# Altium footprint library Test_Stand_Pergam.PcbLib: 34 footprints (part 3 of 3)
Each footprint in its own frame and in the unit in brackets; x right, y up, seen from the top. Pads: shape width x height; smd on the part's side, far side on the other; paste and mask are expansions set on the pad; w line width, h text height; cw(c..) or ccw(c..) is an arc to the next point about the centre after c.
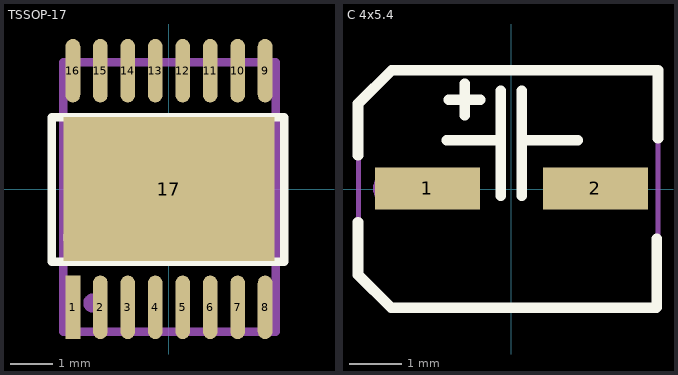
[diagram p2: the footprints below, top view; thin cyan lines are the x and y axes]

## TSSOP-17 [mm] "16+1-Lead Thin Shrink Small Outline Package [TSSOP]"
height 1.2
pads (17):
  rect 0.35x1.5 smd: 1(-2.275,-2.8)
  oval 0.35x1.5 smd: 2(-1.625,-2.8) 3(-0.975,-2.8) 4(-0.325,-2.8) 5(0.325,-2.8) 6(0.975,-2.8) 7(1.625,-2.8) 8(2.275,-2.8) 9(2.275,2.8) 10(1.625,2.8) 11(0.975,2.8) 12(0.325,2.8) 13(-0.325,2.8) 14(-0.975,2.8) 15(-1.625,2.8) 16(-2.275,2.8)
  rect 5x3.4 smd: 17(0,0)
Top Overlay:
  circle w0.254: c-2.275,-1.15 r0.1
  lines w0.2: -2.775,-1.725 2.725,-1.725 2.725,1.7 -2.775,1.7 -2.775,-1.725
Mechanical 29:
  circle w0.254: c-1.8,-2.7 r0.1
  lines w0.2: -2.5,-3.375 2.525,-3.375 2.525,3 -2.5,3 -2.5,-3.375
  text "'.Designator'" at 0.5,-1.8 h1
3D body "TSSOP-16-1EP_4.4x5mm_P0.65mm.step": height 1.1, standoff 0, extent -2.475,-3.4 2.525,3

## С 4x5.4 [mm]
pads (2):
  rect 2x0.8 smd: 1(-1.6,0.01) 2(1.6,0.01)
Top Overlay:
  lines w0.2: -2.92,-0.63 -2.92,-1.63 -2.29,-2.26 2.76,-2.26 2.77,-2.25 2.77,-0.95 ; -2.92,0.64 -2.92,1.62 -2.28,2.26 ; -1.23,0.93 -0.23,0.93 ; -1.19,1.7 -0.59,1.7 ; -0.89,1.4 -0.89,2 ; -0.2,-0.13 -0.2,1.87 ; 0.2,-0.13 0.2,1.87 ; 0.26,0.93 1.26,0.93 ; 2.79,0.97 2.79,2.26 -2.28,2.26 ; -2.28,2.26 -2.28,2.26
Mechanical 29:
  circle w0.38: c-2.24,0.01 r0.204
  lines w0.1: -2.309,-2.251 -2.91,-1.65 -2.91,1.63 -2.309,2.231 ; -2.3,-2.26 2.79,-2.26 2.79,2.24 -2.3,2.24
  text "'.Designator'" at -1.69,-0.58 h1